# Altium footprint library SWLIB(150721).PcbLib: 348 footprints (part 14 of 22)
Each footprint in its own frame and in the unit in brackets; x right, y up, seen from the top. Pads: shape width x height; smd on the part's side, far side on the other; paste and mask are expansions set on the pad; w line width, h text height; cw(c..) or ccw(c..) is an arc to the next point about the centre after c.
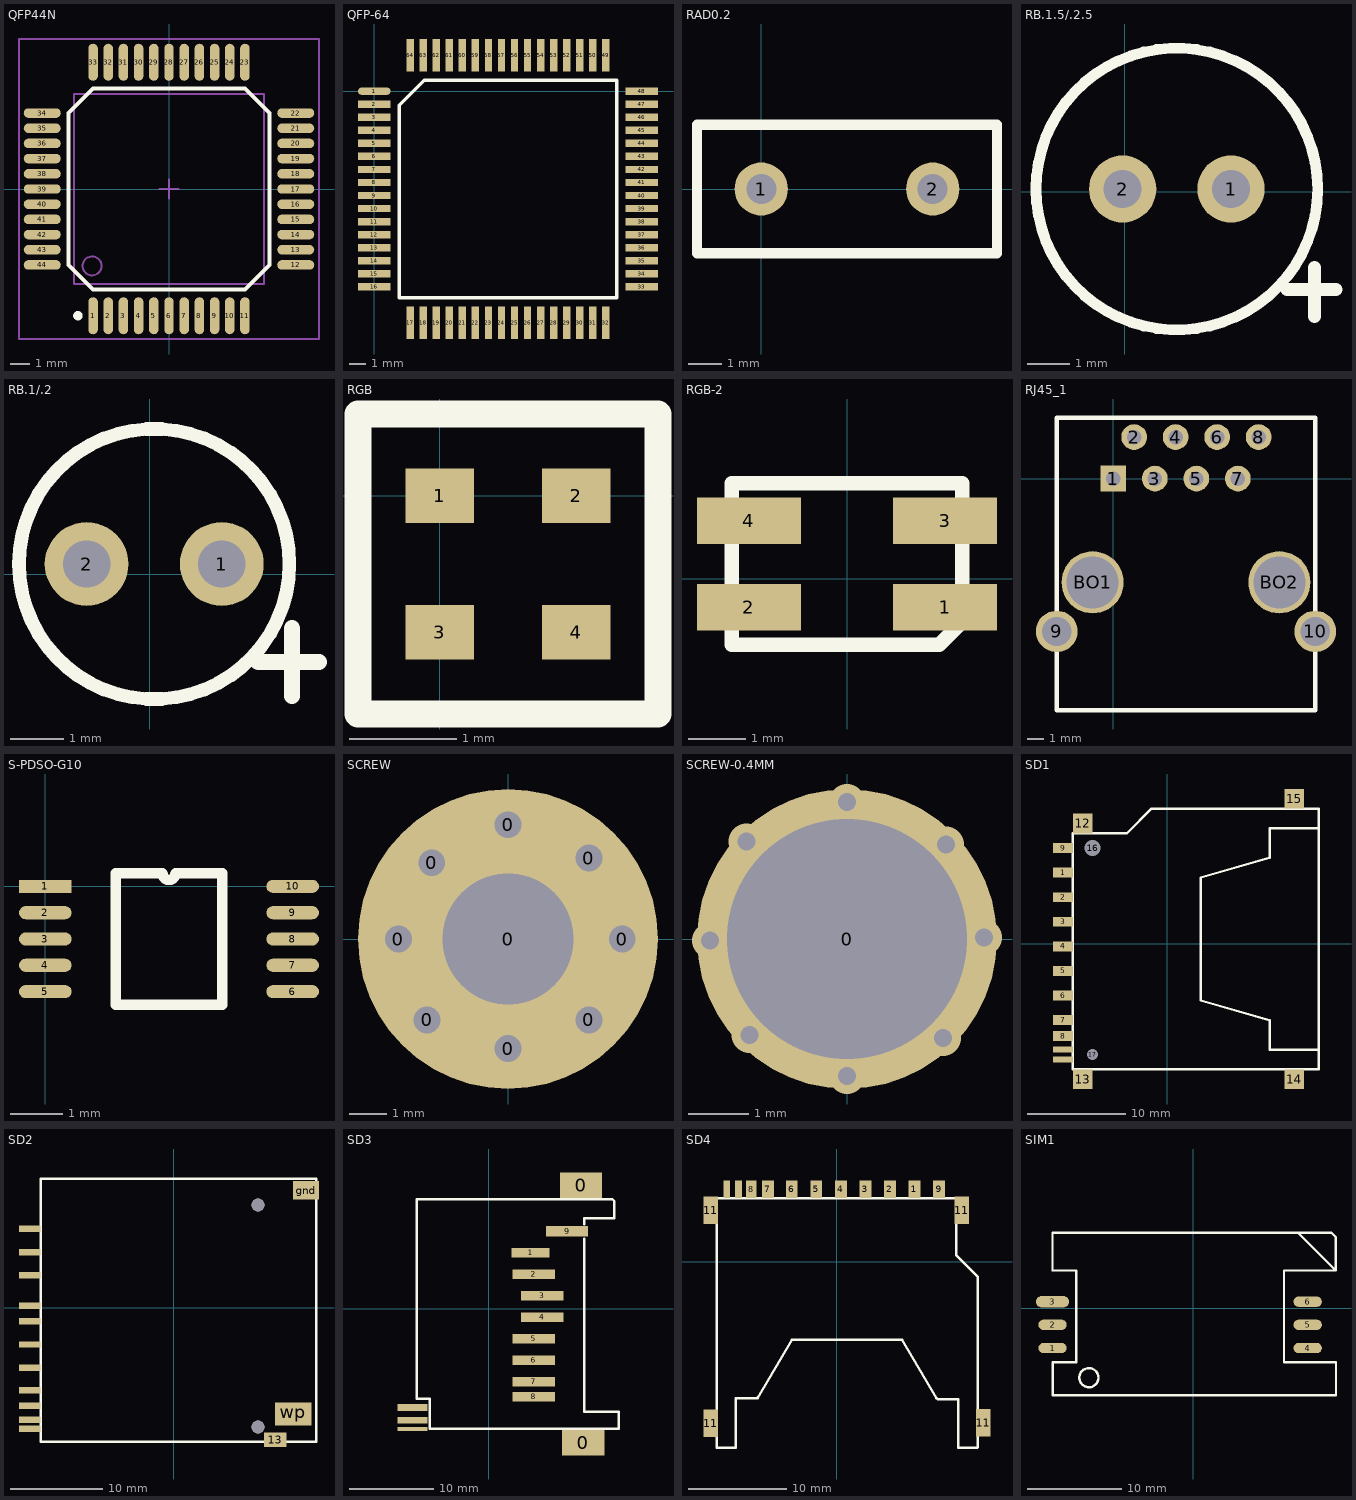
[diagram p13: the footprints below, top view; thin cyan lines are the x and y axes]

## QFP44N [mm] "CQFP, 44-Leads, Body 14.0x14.0mm (max), Pitch 0.80mm, IPC Medium Density"
height 2.1
pads (44):
  oval 0.5x1.95 smd: 1(-4,-6.675) 2(-3.2,-6.675) 3(-2.4,-6.675) 4(-1.6,-6.675) 5(-0.8,-6.675) 6(0,-6.675) 7(0.8,-6.675) 8(1.6,-6.675) 9(2.4,-6.675) 10(3.2,-6.675) 11(4,-6.675) 23(4,6.675) 24(3.2,6.675) 25(2.4,6.675) 26(1.6,6.675) 27(0.8,6.675) 28(0,6.675) 29(-0.8,6.675) 30(-1.6,6.675) 31(-2.4,6.675) 32(-3.2,6.675) 33(-4,6.675)
  oval 1.95x0.5 smd: 12(6.675,-4) 13(6.675,-3.2) 14(6.675,-2.4) 15(6.675,-1.6) 16(6.675,-0.8) 17(6.675,0) 18(6.675,0.8) 19(6.675,1.6) 20(6.675,2.4) 21(6.675,3.2) 22(6.675,4) 34(-6.675,4) 35(-6.675,3.2) 36(-6.675,2.4) 37(-6.675,1.6) 38(-6.675,0.8) 39(-6.675,0) 40(-6.675,-0.8) 41(-6.675,-1.6) 42(-6.675,-2.4) 43(-6.675,-3.2) 44(-6.675,-4)
Top Overlay:
  circle w0.25: c-4.8,-6.675 r0.125
  lines w0.2: -5.3,-4 -5.3,4 -4,5.3 4,5.3 5.3,4 5.3,-4 4,-5.3 -4,-5.3 -5.3,-4
Mechanical 13:
  circle w0.1: c-4.05,-4.05 r0.5
  lines w0.1: -5,-5 5,-5 5,5 -5,5 -5,-5
Mechanical 15:
  lines w0.1: -0.5,0 0.5,0 ; 0,-0.5 0,0.5 ; -7.9,-7.9 7.9,-7.9 7.9,7.9 -7.9,7.9 -7.9,-7.9
3D body: height 2.1, standoff 1.85, extent -5,-5 5,5

## QFP-64 [mm]
pads (64):
  oval 2x0.45 smd: 1(0,0)
  rect 2x0.45 smd: 2(0,-0.8) 3(0,-1.6) 4(0,-2.4) 5(0,-3.2) 6(0,-4) 7(0,-4.8) 8(0,-5.6) 9(0,-6.4) 10(0,-7.2) 11(0,-8) 12(0,-8.8) 13(0,-9.6) 14(0,-10.4) 15(0,-11.2) 16(0,-12) 33(16.4,-12) 34(16.4,-11.2) 35(16.4,-10.4) 36(16.4,-9.6) 37(16.4,-8.8) 38(16.4,-8) 39(16.4,-7.2) 40(16.4,-6.4) 41(16.4,-5.6) 42(16.4,-4.8) 43(16.4,-4) 44(16.4,-3.2) 45(16.4,-2.4) 46(16.4,-1.6) 47(16.4,-0.8) 48(16.4,0)
  rect 0.45x2 smd: 17(2.2,-14.2) 18(3,-14.2) 19(3.8,-14.2) 20(4.6,-14.2) 21(5.4,-14.2) 22(6.2,-14.2) 23(7,-14.2) 24(7.8,-14.2) 25(8.6,-14.2) 26(9.4,-14.2) 27(10.2,-14.2) 28(11,-14.2) 29(11.8,-14.2) 30(12.6,-14.2) 31(13.4,-14.2) 32(14.2,-14.2) 49(14.2,2.2) 50(13.4,2.2) 51(12.6,2.2) 52(11.8,2.2) 53(11,2.2) 54(10.2,2.2) 55(9.4,2.2) 56(8.6,2.2) 57(7.8,2.2) 58(7,2.2) 59(6.2,2.2) 60(5.4,2.2) 61(4.6,2.2) 62(3.8,2.2) 63(3,2.2) 64(2.2,2.2)
Top Overlay:
  lines w0.2: 1.535,-12.665 14.865,-12.665 14.865,0.665 3.07,0.665 1.535,-0.87 1.535,-12.665

## RAD0.2 [mil]
pads (2):
  round 62 hole 35: 1(0,0) 2(200,0)
Top Overlay:
  lines w12: -75,-75 275,-75 275,75 -75,75 -75,-75

## RB.1.5/.2.5 [mil]
pads (2):
  round 62 hole 35: 1(98.11,2.56) 2(-1.89,2.56)
Top Overlay:
  circle w10: c48.11,2.56 r130
  lines w12: 150,-90 195,-90 ; 175,-115 175,-70

## RB.1/.2 [mil]
pads (2):
  round 62 hole 35: 1(53.11,7.56) 2(-46.89,7.56)
Top Overlay:
  circle w10: c3.11,7.56 r100
  lines w12: 80,-65 125,-65 ; 105,-90 105,-40

## RGB [mil]
pads (4):
  rect 25x20 smd: 1(0,0) 2(50,0) 3(0,-50) 4(50,-50)
Top Overlay:
  lines w10: -30,-80 80,-80 80,30 -30,30 -30,-60 -30,-80

## RGB-2 [mm]
height 5.7
pads (4):
  rect 1.8x0.8 smd: 1(1.7,-0.496) 2(-1.7,-0.496) 3(1.7,1.004) 4(-1.7,1.004)
Top Overlay:
  lines w0.254: -2,-1.146 1.5,-1.146 1.6,-1.146 2,-0.746 2,1.654 0,1.654 -2,1.654 -2,-1.146
3D body "User Library-PLCC4RGBCT-CA LED SMD RGB.STEP": height 1.93, standoff 0.03, extent -1.75,-1.143 1.75,1.657

## RJ45_1 [mil]
pads (12):
  rect 62x62 hole 35: 1(0,0)
  round 62 hole 35: 2(50,100) 3(100,0) 4(150,100) 5(200,0) 6(250,100) 7(300,0) 8(350,100)
  round 100 hole 70: 9(-136.42,-368.11) 10(486.42,-368.11)
  round 150 hole 125: BO1(-50,-250) BO2(400,-250)
Top Overlay:
  lines w10: -136.42,-558.33 486.42,-558.33 486.42,146.67 -136.42,146.67 -136.42,-558.33

## S-PDSO-G10 [mm]
pads (10):
  rect 1x0.25 smd: 1(0,0)
  oval 1x0.25 smd: 2(0,-0.5) 3(0,-1) 4(0,-1.5) 5(0,-2) 6(4.7,-2) 7(4.7,-1.5) 8(4.7,-1) 9(4.7,-0.5) 10(4.7,0)
Top Overlay:
  lines w0.2: 1.335,-2.25 1.335,0.25 2.225,0.25 ccw(c2.35,0.25) 2.475,0.25 3.365,0.25 3.365,-2.25 1.335,-2.25
3D body: height 2, standoff 0.2, extent 0.584,-2.21 4.115,0.279

## SCREW [mil]
pads (9):
  round 50 hole 27.99: 0(-115,0) 0(-85,-85) 0(-80,80) 0(0,-115) 0(0,120) 0(85,-85) 0(85,85) 0(120,0)
  round 314.96 hole 137.8: 0(0,0)

## SCREW-0.4MM [mm]
pads (1):
  round 5 hole 4: 0(0,0)
via -1.676,1.626 diameter 0.6 hole 0.3
via -2.286,-0.025 diameter 0.6 hole 0.3
via -1.626,-1.6 diameter 0.6 hole 0.3
via 0,-2.286 diameter 0.6 hole 0.3
via 1.6,-1.651 diameter 0.6 hole 0.3
via 2.286,0.025 diameter 0.6 hole 0.3
via 1.651,1.575 diameter 0.6 hole 0.3
via 0,2.286 diameter 0.6 hole 0.3

## SD1 [mm]
pads (17):
  rect 2x1 smd: 1(-10.607,7.258) 2(-10.607,4.758) 3(-10.607,2.258) 4(-10.607,-0.242) 5(-10.607,-2.742) 6(-10.607,-5.242) 7(-10.607,-7.742) 8(-10.607,-9.367) 9(-10.607,9.758)
  rect 2x0.6 smd: 10(-10.607,-11.742) 11(-10.607,-10.742)
  rect 2x2 smd: 12(-8.607,12.258) 13(-8.607,-13.742) 14(12.893,-13.742) 15(12.893,14.758)
  round 1.5 hole 1.6: 16(-7.607,9.758)
  round 1 hole 1.1: 17(-7.607,-11.242)
Top Overlay:
  lines w0.254: 15.393,-10.742 10.393,-10.742 10.393,-7.742 3.393,-5.742 3.393,6.758 10.393,8.758 10.393,11.758 15.393,11.758 ; -9.607,-12.742 -9.607,11.258 -4.107,11.258 -1.607,13.758 15.393,13.758 15.393,-12.742 -9.607,-12.742

## SD2 [mm]
pads (14):
  rect 2.35x0.7 smd: 1(-15.57,6.038) 2(-15.57,3.538) 3(-15.57,0.238) 4(-15.57,-1.462) 5(-15.57,-3.962) 6(-15.57,-6.462) 7(-15.57,-8.892) 8(-15.57,-10.582) 9(-15.57,8.538) cd(-15.57,-12.082) com(-15.57,-13.082)
  rect 2.4x1.6 smd: 13(10.96,-14.262)
  rect 2.8x2 smd: gnd(14.3,12.738)
  rect 3.95x2.5 smd: wp(12.93,-11.462)
via 9.1,11.138 diameter 1.4 hole 1.4
via 9.1,-12.862 diameter 1.4 hole 1.4
Top Overlay:
  lines w0.254: -14.395,-14.482 15.41,-14.482 15.41,13.958 -14.395,13.958 -14.395,-14.482

## SD3 [mil]
pads (14):
  rect 196.85x118.11 smd: 0(430,574.99) 0(440,-625.01)
  rect 177.16x45 smd: 1(195,260)
  rect 196.85x45 smd: 2(210,160) 3(250,60) 4(250,-40) 5(210,-140) 6(210,-240) 7(210,-340) 8(210,-410)
  rect 196.85x50 smd: 9(365,360)
  rect 140x31.5 smd: 10(-355.02,-460.02) 11(-355.02,-520.02)
  rect 140x19.68 smd: 12(-355.02,-560.02)
Top Overlay:
  lines w11.81: 344.98,-560.02 604.98,-560.02 604.98,-480.02 444.98,-480.02 444.98,324.94 ; 364.98,-560.02 -275.02,-560.02 -275.02,-420.02 -335.02,-420.02 -335.02,509.98 364.98,509.98 574.98,509.98 584.98,499.98 584.98,419.98 444.98,419.98 444.98,391.91

## SD4 [mm]
pads (15):
  rect 1.2x1.8 smd: 1(7.897,7.375) 2(5.408,7.375) 3(2.914,7.366) 4(0.414,7.366) 5(-2.086,7.366) 6(-4.586,7.366) 7(-7.011,7.366) 9(10.414,7.366)
  rect 1.1x1.8 smd: 8(-8.715,7.375)
  rect 0.7x1.8 smd: 10(-10.011,7.366) 12(-11.204,7.375)
  rect 1.5x2.8 smd: 11(-12.829,-16.459) 11(-12.829,5.232) 11(12.723,5.232) 11(14.907,-16.408)
Top Overlay:
  lines w0.254: -10.261,-13.925 -10.261,-18.925 -12.234,-18.925 -12.234,6.461 -12.22,6.475 12.139,6.475 12.139,0.665 14.328,-1.524 14.339,-1.524 14.339,-18.898 14.312,-18.925 12.339,-18.925 12.339,-14.026 10.297,-14.026 10.139,-13.868 ; -10.21,-13.919 -8.168,-13.919 -8.01,-13.761 ; -8.061,-13.919 -4.549,-7.925 ; -4.561,-7.925 6.639,-7.925 10.139,-13.919
Multi-Layer:
  circle w0.254: c10.539,4.115 r0.82
  circle w0.254: c-10.493,4.075 r0.58

## SIM1 [mm]
pads (6):
  oval 3x1.1 smd: 1(-14.897,-4.228) 2(-14.897,-1.778) 4(12.103,-4.228) 5(12.103,-1.778) 6(12.103,0.672)
  oval 3.5x1.2 smd: 3(-14.897,0.672)
Top Overlay:
  circle w0.254: c-11.049,-7.366 r1.016
  lines w0.254: -14.892,-9.208 -14.892,-5.728 -12.397,-5.728 -12.397,3.957 ; -14.872,-9.228 15.103,-9.228 ; -12.397,3.972 -14.889,3.972 -14.897,3.98 -14.897,7.972 14.614,7.972 15.07,7.516 15.07,3.972 ; 9.603,-5.728 9.603,3.972 15.07,3.972 ; 9.608,-5.728 13.526,-5.728 ; 11.07,7.972 15.07,3.972 ; 13.145,-5.728 15.098,-5.728 15.098,-9.223